# Altium footprint library JL_PCB.PCBLIB: 1129 footprints (part 1 of 72)
Each footprint in its own frame and in the unit in brackets; x right, y up, seen from the top. Pads: shape width x height; smd on the part's side, far side on the other; paste and mask are expansions set on the pad; w line width, h text height; cw(c..) or ccw(c..) is an arc to the next point about the centre after c.
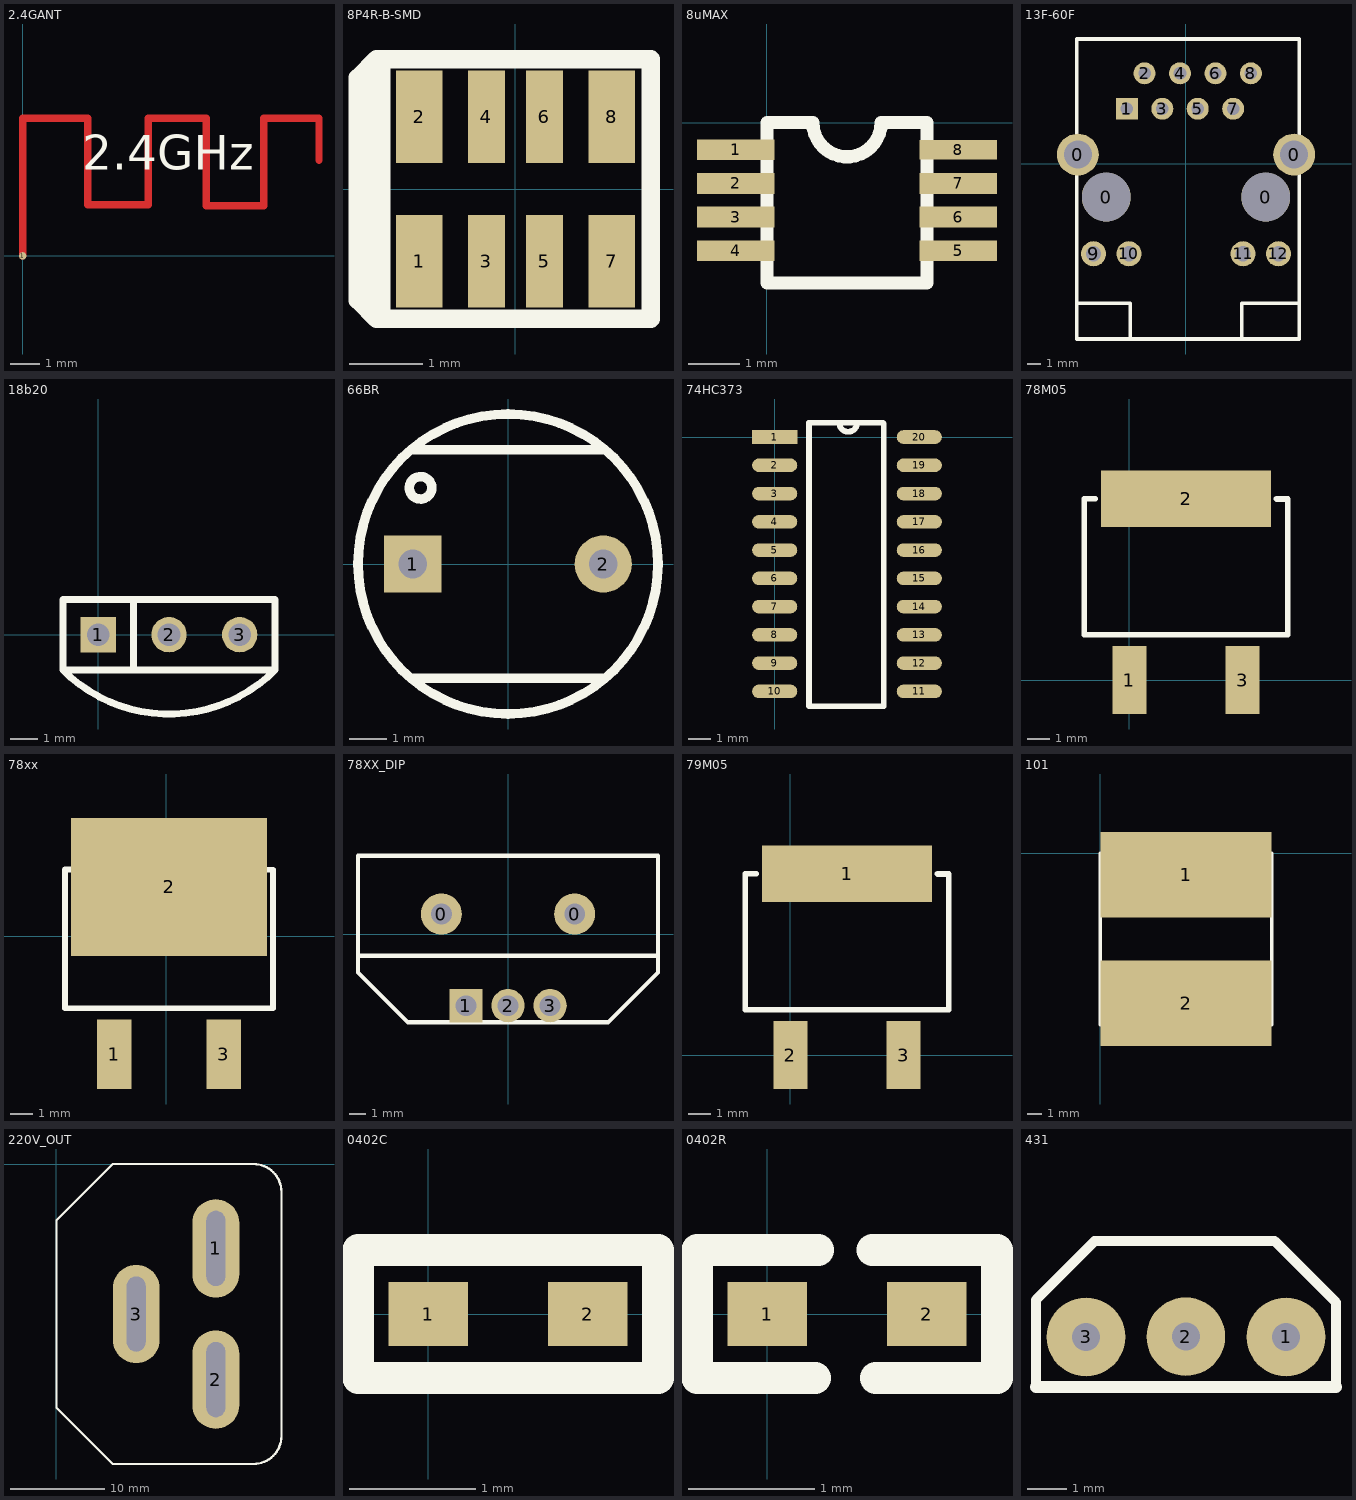
[diagram p0: the footprints below, top view; thin cyan lines are the x and y axes]

## 2.4GANT [mil]
pads (1):
  round 10 smd: 1(0,0)
TopLayer:
  lines w10: 0,0 0,184.44 87.31,184.44 87.31,68.55 168.31,68.55 168.31,184.44 246.31,184.44 246.31,67.55 323.31,67.55 323.31,184.44 397.31,184.44 397.31,128.44
TopOverlay:
  text "2.4GHz" at 80,100 h78.74

## 8P4R-B-SMD [mil]
pads (8):
  rect 25x50 smd: 1(-52,-39) 2(-52,39) 7(52,-39) 8(52,39)
  rect 20x50 smd: 3(-15.7,-39) 4(-15.7,39) 5(15.7,-39) 6(15.7,39)
TopOverlay:
  lines w10: -85,-60 -85,60 -75,70 -75,-70 -85,-60 ; -72.42,-70 -72.42,70 72.96,70 72.96,-70 -72.42,-70

## 8uMAX [mm]
height 1.1
pads (8):
  rect 1.5x0.4 smd: 1(-0.6,-0.525) 2(-0.6,-1.175) 3(-0.6,-1.825) 4(-0.6,-2.475) 5(3.7,-2.475) 6(3.7,-1.825) 7(3.7,-1.175)
  rect 1.5x0.38 smd: 8(3.7,-0.525)
TopOverlay:
  lines w0.254: 0,-3.1 0,0 0.89,0 ccw(c1.55,0) 2.21,0 3.1,0 3.1,-3.1 0,-3.1

## 13F-60F [mm]
pads (16):
  round 3 hole 2: 0(-7.75,0.642) 0(7.75,0.642)
  round 3.5 hole 3.5: 0(-5.715,-2.408) 0(5.715,-2.408)
  rect 1.575x1.575 hole 0.9: 1(-4.239,3.928)
  round 1.575 hole 0.9: 2(-2.969,6.468) 3(-1.699,3.928) 4(-0.429,6.468) 5(0.841,3.928) 6(2.111,6.468) 7(3.381,3.928) 8(4.651,6.468)
  round 1.8 hole 1.1: 9(-6.63,-6.468) 10(-4.09,-6.468) 11(4.09,-6.468) 12(6.63,-6.468)
TopOverlay:
  lines w0.254: -7.843,-12.578 -7.843,8.922 ; -7.843,8.928 -6.544,8.928 8.127,8.928 ; -7.835,-10 -4,-10 -4,-12.497 ; -7.823,-12.578 8.127,-12.578 ; 4,-12.548 4,-10 8.085,-10 ; 8.128,-12.578 8.128,8.922
3D body "User Library-RMS-001L-08A0-GY.STEP": height 13.02, standoff -3.78, extent -7.822,-12.446 8.178,8.854

## 18b20 [mil]
pads (3):
  rect 50x50 hole 32: 1(0,0)
  round 50 hole 32: 2(100,0) 3(200,0)
TopOverlay:
  lines w10: 50,-50 50,50 ; -50,-50 ccw(c100,100) 250,-50 ; -50,-50 -50,50 250,50 250,-50 ; -50,-50 250,-50

## 66BR [mil]
pads (2):
  rect 60x60 hole 30: 1(-100,0)
  round 60 hole 30: 2(100,0)
TopOverlay:
  circle w10: c0,0 r157.48
  circle w10: c-91.81,80 r11.81
  lines w10: -100,-120 100,-120 ; -100,120 100,120

## 74HC373 [mil]
pads (20):
  rect 80x24 smd: 1(0,0)
  oval 80x24 smd: 2(0,-50) 3(0,-100) 4(0,-150) 5(0,-200) 6(0,-250) 7(0,-300) 8(0,-350) 9(0,-400) 10(0,-450) 11(255.91,-450) 12(255.91,-400) 13(255.91,-350) 14(255.91,-300) 15(255.91,-250) 16(255.91,-200) 17(255.91,-150) 18(255.91,-100) 19(255.91,-50) 20(255.91,0)
TopOverlay:
  lines w10: 61.38,23.62 60.95,24.05 60.95,-476.38 ; 114.17,25 ccw(c129.92,25) 145.67,25 ; 191.53,25 60,25 60,-375 60,-475.43 60.95,-476.38 ; 192.91,23.62 192.91,-476.38 60.95,-476.38

## 78M05 [mil]
pads (3):
  rect 60x120 smd: 1(0,0) 3(200,0)
  rect 300x100 smd: 2(100,320)
TopOverlay:
  lines w10: -60.16,320.16 -80,320.16 ; 260,320 260.16,319.84 280,319.84 280,80 -80,80 ; -80,80 -80,320.16 ; -80,80 -80,320.16
3D body "D-PAK.STEP": height 90.94, standoff 0, extent -28.92,-21.14 230.92,343.03

## 78xx [mil]
pads (3):
  rect 60x120 smd: 1(-90,-205) 3(100,-205)
  rect 339.37x239.37 smd: 2(5,85)
TopOverlay:
  lines w10: -155.16,115.16 -175,115.16 ; 165,115 165.16,114.84 185,114.84 185,-125 -175,-125 ; -175,-125 -175,115.16 ; -175,-125 -175,115.16

## 78XX_DIP [mil]
pads (5):
  round 98.42 hole 50: 0(-160,48) 0(160,48)
  rect 80x80 hole 50: 1(-101,-172)
  round 80 hole 50: 2(0,-172) 3(101,-172)
TopOverlay:
  lines w10: -360,-52 360,-52 ; -360,-92 -240,-212 240,-212 360,-92 360,188 -360,188 -360,-92
3D body "User Library-TO-220 Con Disipador 34M8491.STEP": height 1159.52, standoff -245.89, extent -607.83,-592.94 600.33,597.25

## 79M05 [mil]
pads (3):
  rect 300x100 smd: 1(100,320)
  rect 60x120 smd: 2(0,0) 3(200,0)
TopOverlay:
  lines w10: -60.16,320.16 -80,320.16 ; 260,320 260.16,319.84 280,319.84 280,80 -80,80 ; -80,80 -80,320.16 ; -80,80 -80,320.16

## 101 [mm]
pads (2):
  rect 12x6 smd: 1(6,-1.5) 2(6,-10.5)
TopOverlay:
  lines w0.254: 0,-12 0,0 12,0 12,-12 0,-12

## 220V_OUT [mm]
pads (3):
  oval 5x10.5 hole 2 slot 8 at 90 deg: 1(17,-9) 2(17,-23) 3(8.5,-16)
TopOverlay:
  lines w0.254: 0,-26 6,-32 21,-32 ccw(c21,-29) 24,-29 24,-3 ccw(c21,-3) 21,0 6.706,0 6,0 0,-6 0,-26

## 0402C [mil]
pads (2):
  rect 25x20 smd: 1(0,0) 2(50,0)
TopOverlay:
  lines w10: -22,-20 -22,20 33,20 72,20 72,-20 34,-20 -22,-20
3D body "SW3dPS-0402 SMD Capacitor.STEP": height 8.55, standoff 0.6, extent 4.31,-12 43.69,11.62

## 0402R [mil]
pads (2):
  rect 25x20 smd: 1(0,0) 2(50,0)
TopOverlay:
  lines w10: 15,-20 -22,-20 -22,20 16,20 ; 33,20 72,20 72,-20 34,-20
3D body "User Library-res0402-1.STEP": height 11.81, standoff 0, extent 4.31,-9.85 43.68,9.84

## 431 [mm]
pads (3):
  round 2 hole 0.711: 1(39.402,-63.902) 2(36.858,-63.896) 3(34.322,-63.902)
TopOverlay:
  lines w0.254: 33.052,-65.172 33.052,-62.96 34.544,-61.468 39.116,-61.468 40.672,-63.024 40.672,-65.172
  lines w0.305: 33.052,-65.172 40.672,-65.172
3D body "TO-92_Bent.STEP": height 12.39, standoff -6.6, extent 27.679,-71.166 45.441,-55.701